# Altium footprint library Connectors.PcbLib: 70 footprints (part 1 of 5)
Each footprint in its own frame and in the unit in brackets; x right, y up, seen from the top. Pads: shape width x height; smd on the part's side, far side on the other; paste and mask are expansions set on the pad; w line width, h text height; cw(c..) or ccw(c..) is an arc to the next point about the centre after c.
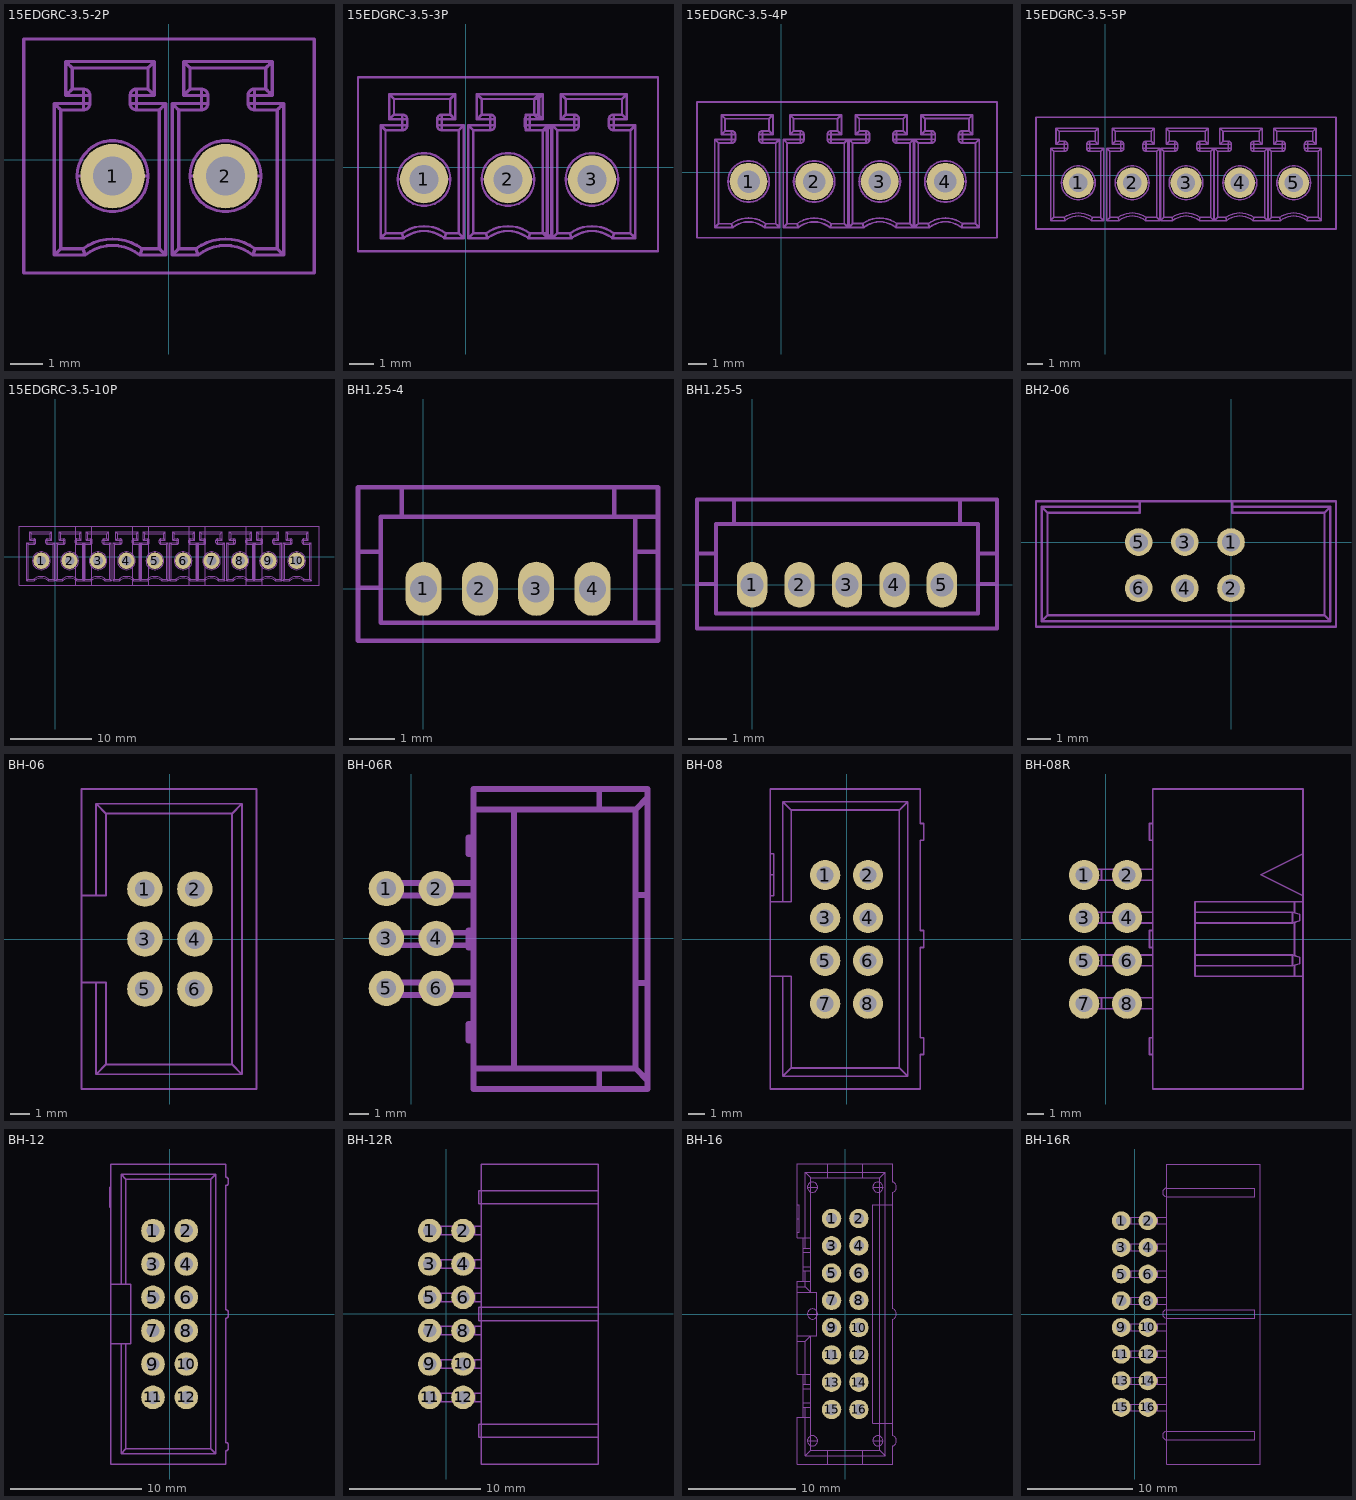
[diagram p0: the footprints below, top view; thin cyan lines are the x and y axes]

## 15EDGRC-3.5-2P [mm]
pads (2):
  round 2 hole 1.2: 1(-1.75,-0.5) 2(1.75,-0.5)
Top Assembly:
  drawing of 660 lines, arcs and shapes, not listed
3D body "12h8910_284514-2.stp": height 9.5, standoff -3.1, extent -4.5,-3.5 4.5,3.75

## 15EDGRC-3.5-3P [mm]
pads (3):
  round 2 hole 1.2: 1(-1.75,-0.5) 2(1.75,-0.5) 3(5.25,-0.5)
Top Assembly:
  drawing of 1141 lines, arcs and shapes, not listed
3D body "12h8910_284514-2.stp": height 9.5, standoff -3.1, extent -1,-3.5 8,3.75
3D body "12h8910_284514-2.stp": height 9.5, standoff -3.1, extent -4.5,-3.5 4.5,3.75

## 15EDGRC-3.5-4P [mm]
pads (4):
  round 2 hole 1.2: 1(-1.75,-0.5) 2(1.75,-0.5) 3(5.25,-0.5) 4(8.75,-0.5)
Top Assembly:
  drawing of 1317 lines, arcs and shapes, not listed
3D body "12h8910_284514-2.stp": height 9.5, standoff -3.1, extent -4.5,-3.5 4.5,3.75
3D body "12h8910_284514-2.stp": height 9.5, standoff -3.1, extent 2.5,-3.499 11.5,3.751

## 15EDGRC-3.5-5P [mm]
pads (5):
  round 2 hole 1.2: 1(-1.75,-0.5) 2(1.75,-0.5) 3(5.25,-0.5) 4(8.75,-0.5) 5(12.25,-0.5)
Top Assembly:
  drawing of 1700 lines, arcs and shapes, not listed
3D body "12h8910_284514-2.stp": height 9.5, standoff -3.1, extent -4.5,-3.5 4.5,3.75
3D body "12h8910_284514-2.stp": height 9.5, standoff -3.1, extent 2.5,-3.499 11.5,3.751
3D body "12h8910_284514-2.stp": height 9.5, standoff -3.1, extent 6,-3.499 15,3.751

## 15EDGRC-3.5-10P [mm]
pads (10):
  round 2 hole 1.2: 1(-1.75,-0.5) 2(1.75,-0.5) 3(5.25,-0.5) 4(8.75,-0.5) 5(12.25,-0.5) 6(15.75,-0.5) 7(19.25,-0.5) 8(22.75,-0.5) 9(26.25,-0.5) 10(29.75,-0.5)
Top Assembly:
  drawing of 3300 lines, arcs and shapes, not listed
3D body "12h8910_284514-2.stp": height 9.5, standoff -3.1, extent -4.5,-3.5 4.5,3.75
3D body "12h8910_284514-2.stp": height 9.5, standoff -3.1, extent 2.5,-3.5 11.5,3.75
3D body "12h8910_284514-2.stp": height 9.5, standoff -3.1, extent 9.5,-3.5 18.5,3.75
3D body "12h8910_284514-2.stp": height 9.5, standoff -3.1, extent 16.5,-3.5 25.5,3.75
3D body "12h8910_284514-2.stp": height 9.5, standoff -3.1, extent 23.5,-3.5 32.5,3.75

## BH1.25-4 [mm]
pads (4):
  oval 0.8x1.2 hole 0.6: 1(0,0) 2(1.25,0) 3(2.5,0) 4(3.75,0)
Top Assembly:
  lines w0.1: 4.7,-0.75 4.7,0.025 4.7,0.825 ; 5.2,-0.75 -0.95,-0.75 -0.95,0.025 ; 5.2,1.6 -0.475,1.6 ; -1.45,0.025 -1.45,-1.15 5.2,-1.15 5.2,0.025 5.2,0.825 ; -1.45,0.025 -0.95,0.025 ; -1.45,0.025 -1.45,0.825 ; -1.45,0.825 -1.45,2.25 -0.475,2.25 ; -1.45,0.825 -0.95,0.825 ; -0.95,0.025 -0.95,0.825 ; -0.95,0.825 -0.95,1.6 -0.475,1.6 ; -0.475,1.6 -0.475,2.25 ; -0.475,2.25 5.2,2.25 ; -0.175,-0.115 -0.1,-0.04 ; -0.175,-0.115 0.175,-0.115 ; -0.175,-0.115 -0.175,0.235 ; -0.175,-0.115 -0.1,-0.04 ; -0.175,0.235 -0.1,0.16 ; -0.175,0.235 0.175,0.235 ; -0.175,0.235 -0.1,0.16 ; -0.1,-0.04 0.1,-0.04 ; -0.1,-0.04 -0.1,0.16 ; -0.1,-0.04 -0.1,0.16 ; -0.1,-0.04 0.1,-0.04 ; -0.1,0.16 0.1,0.16 ; -0.1,0.16 0.1,0.16 ; 0.1,-0.04 0.175,-0.115 ; 0.1,-0.04 0.1,0.16 ; 0.1,-0.04 0.1,0.16 ; 0.1,-0.04 0.175,-0.115 ; 0.1,0.16 0.175,0.235 ; 0.1,0.16 0.175,0.235 ; 0.175,-0.115 0.175,0.235 ; 1.075,-0.115 1.425,-0.115 ; 1.075,-0.115 1.15,-0.04 ; 1.075,-0.115 1.075,0.235 ; 1.075,-0.115 1.15,-0.04 ; 1.075,0.235 1.425,0.235 ; 1.075,0.235 1.15,0.16 ; 1.075,0.235 1.15,0.16 ; 1.15,-0.04 1.35,-0.04 ; 1.15,-0.04 1.15,0.16 ; 1.15,-0.04 1.35,-0.04 ; 1.15,-0.04 1.15,0.16 ; 1.15,0.16 1.35,0.16 ; 1.15,0.16 1.35,0.16 ; 1.35,-0.04 1.425,-0.115 ; 1.35,-0.04 1.35,0.16 ; 1.35,-0.04 1.425,-0.115 ; 1.35,-0.04 1.35,0.16 ; 1.35,0.16 1.425,0.235 ; 1.35,0.16 1.425,0.235 ; 1.425,-0.115 1.425,0.235 ; 2.325,-0.115 2.325,0.235 ; 2.325,-0.115 2.4,-0.04 ; 2.325,-0.115 2.675,-0.115 ; 2.325,-0.115 2.4,-0.04 ; 2.325,0.235 2.4,0.16 ; 2.325,0.235 2.675,0.235 ; 2.325,0.235 2.4,0.16 ; 2.4,-0.04 2.6,-0.04 ; 2.4,-0.04 2.4,0.16 ; 2.4,-0.04 2.4,0.16 ; 2.4,-0.04 2.6,-0.04 ; 2.4,0.16 2.6,0.16 ; 2.4,0.16 2.6,0.16 ; 2.6,-0.04 2.675,-0.115 ; 2.6,-0.04 2.6,0.16 ; 2.6,-0.04 2.6,0.16 ; 2.6,-0.04 2.675,-0.115 ; 2.6,0.16 2.675,0.235 ; 2.6,0.16 2.675,0.235 ; 2.675,-0.115 2.675,0.235 ; 3.575,-0.115 3.925,-0.115 ; 3.575,-0.115 3.65,-0.04 ; 3.575,-0.115 3.575,0.235 ; 3.575,-0.115 3.65,-0.04 ; 3.575,0.235 3.925,0.235 ; 3.575,0.235 3.65,0.16 ; 3.575,0.235 3.65,0.16 ; 3.65,-0.04 3.85,-0.04 ; 3.65,-0.04 3.65,0.16 ; 3.65,-0.04 3.65,0.16 ; 3.65,-0.04 3.85,-0.04 ; 3.65,0.16 3.85,0.16 ; 3.65,0.16 3.85,0.16 ; 3.85,-0.04 3.925,-0.115 ; 3.85,-0.04 3.85,0.16 ; 3.85,-0.04 3.85,0.16 ; 3.85,-0.04 3.925,-0.115 ; 3.85,0.16 3.925,0.235 ; 3.85,0.16 3.925,0.235 ; 3.925,-0.115 3.925,0.235 ; 4.7,0.825 5.2,0.825 ; 4.7,0.825 4.7,1.6 4.225,1.6 4.225,2.25 5.2,2.25 ; 5.2,0.825 5.2,2.25

## BH1.25-5 [mm]
pads (5):
  oval 0.8x1.2 hole 0.6: 1(0,0) 2(1.25,0) 3(2.5,0) 4(3.75,0) 5(5,0)
Top Assembly:
  lines w0.1: -1.45,0.025 -1.45,0.825 ; -1.45,0.025 -0.95,0.025 ; -1.45,0.025 -1.45,-1.15 6.45,-1.15 6.45,0.025 ; -1.45,0.825 -0.95,0.825 ; -1.45,0.825 -1.45,2.25 -0.475,2.25 ; -0.95,0.025 -0.95,0.825 ; -0.95,0.025 -0.95,-0.75 5.95,-0.75 5.95,0.025 ; -0.95,0.825 -0.95,1.6 -0.475,1.6 ; -0.475,1.6 -0.475,2.25 ; -0.475,1.6 5.475,1.6 ; -0.475,2.25 5.475,2.25 ; -0.175,-0.115 -0.1,-0.04 ; -0.175,-0.115 -0.175,0.235 ; -0.175,-0.115 0.175,-0.115 ; -0.175,-0.115 -0.1,-0.04 ; -0.175,0.235 -0.1,0.16 ; -0.175,0.235 0.175,0.235 ; -0.175,0.235 -0.1,0.16 ; -0.1,-0.04 0.1,-0.04 ; -0.1,-0.04 -0.1,0.16 ; -0.1,-0.04 -0.1,0.16 ; -0.1,-0.04 0.1,-0.04 ; -0.1,0.16 0.1,0.16 ; -0.1,0.16 0.1,0.16 ; 0.1,-0.04 0.175,-0.115 ; 0.1,-0.04 0.1,0.16 ; 0.1,-0.04 0.1,0.16 ; 0.1,-0.04 0.175,-0.115 ; 0.1,0.16 0.175,0.235 ; 0.1,0.16 0.175,0.235 ; 0.175,-0.115 0.175,0.235 ; 1.075,-0.115 1.15,-0.04 ; 1.075,-0.115 1.075,0.235 ; 1.075,-0.115 1.15,-0.04 ; 1.075,-0.115 1.425,-0.115 ; 1.075,0.235 1.15,0.16 ; 1.075,0.235 1.15,0.16 ; 1.075,0.235 1.425,0.235 ; 1.15,-0.04 1.15,0.16 ; 1.15,-0.04 1.35,-0.04 ; 1.15,-0.04 1.15,0.16 ; 1.15,-0.04 1.35,-0.04 ; 1.15,0.16 1.35,0.16 ; 1.15,0.16 1.35,0.16 ; 1.35,-0.04 1.35,0.16 ; 1.35,-0.04 1.425,-0.115 ; 1.35,-0.04 1.35,0.16 ; 1.35,-0.04 1.425,-0.115 ; 1.35,0.16 1.425,0.235 ; 1.35,0.16 1.425,0.235 ; 1.425,-0.115 1.425,0.235 ; 2.325,-0.115 2.4,-0.04 ; 2.325,-0.115 2.675,-0.115 ; 2.325,-0.115 2.4,-0.04 ; 2.325,-0.115 2.325,0.235 ; 2.325,0.235 2.4,0.16 ; 2.325,0.235 2.675,0.235 ; 2.325,0.235 2.4,0.16 ; 2.4,-0.04 2.6,-0.04 ; 2.4,-0.04 2.4,0.16 ; 2.4,-0.04 2.4,0.16 ; 2.4,-0.04 2.6,-0.04 ; 2.4,0.16 2.6,0.16 ; 2.4,0.16 2.6,0.16 ; 2.6,-0.04 2.675,-0.115 ; 2.6,-0.04 2.6,0.16 ; 2.6,-0.04 2.6,0.16 ; 2.6,-0.04 2.675,-0.115 ; 2.6,0.16 2.675,0.235 ; 2.6,0.16 2.675,0.235 ; 2.675,-0.115 2.675,0.235 ; 3.575,-0.115 3.65,-0.04 ; 3.575,-0.115 3.575,0.235 ; 3.575,-0.115 3.65,-0.04 ; 3.575,-0.115 3.925,-0.115 ; 3.575,0.235 3.65,0.16 ; 3.575,0.235 3.65,0.16 ; 3.575,0.235 3.925,0.235 ; 3.65,-0.04 3.85,-0.04 ; 3.65,-0.04 3.65,0.16 ; 3.65,-0.04 3.65,0.16 ; 3.65,-0.04 3.85,-0.04 ; 3.65,0.16 3.85,0.16 ; 3.65,0.16 3.85,0.16 ; 3.85,-0.04 3.925,-0.115 ; 3.85,-0.04 3.85,0.16 ; 3.85,-0.04 3.85,0.16 ; 3.85,-0.04 3.925,-0.115 ; 3.85,0.16 3.925,0.235 ; 3.85,0.16 3.925,0.235 ; 3.925,-0.115 3.925,0.235 ; 4.825,-0.115 4.9,-0.04 ; 4.825,-0.115 4.825,0.235 ; 4.825,-0.115 4.9,-0.04 ; 4.825,-0.115 5.175,-0.115 ; 4.825,0.235 4.9,0.16 ; 4.825,0.235 5.175,0.235 ; 4.825,0.235 4.9,0.16 ; 4.9,-0.04 5.1,-0.04 ; 4.9,-0.04 4.9,0.16 ; 4.9,-0.04 4.9,0.16 ; 4.9,-0.04 5.1,-0.04 ; 4.9,0.16 5.1,0.16 ; 4.9,0.16 5.1,0.16 ; 5.1,-0.04 5.175,-0.115 ; 5.1,-0.04 5.1,0.16 ; 5.1,-0.04 5.1,0.16 ; 5.1,-0.04 5.175,-0.115 ; 5.1,0.16 5.175,0.235 ; 5.1,0.16 5.175,0.235 ; 5.175,-0.115 5.175,0.235 ; 5.475,1.6 5.95,1.6 5.95,0.825 ; 5.475,1.6 5.475,2.25 ; 5.475,2.25 6.45,2.25 6.45,0.825 ; 5.95,0.025 6.45,0.025 ; 5.95,0.025 5.95,0.825 ; 5.95,0.825 6.45,0.825 ; 6.45,0.025 6.45,0.825
3D body "df13-5p-1_25dsa_50_.stp": height 4.77, standoff -1.83, extent -1.45,-1.15 6.45,2.25

## BH2-06 [mm]
pads (6):
  round 1.2 hole 0.8 paste-25.4: 1(0,0) 2(0,-2) 3(-2,0) 4(-2,-2) 5(-4,0) 6(-4,-2)
Top Assembly:
  lines w0.1: 4,1.275 0.05,1.275 0.05,1.525 ; -8.2,-3.425 -7.95,-3.175 ; -8.2,-3.425 -8.2,1.525 ; -8.2,-3.425 4.3,-3.425 ; -8.2,1.525 -7.95,1.275 ; -8.2,1.525 -3.95,1.525 ; -7.95,-3.175 4.05,-3.175 ; -7.95,-3.175 -7.95,1.275 ; -7.95,1.275 -3.95,1.275 -3.95,1.525 ; -4.2,-2.2 -4.2,-1.7 ; -4.2,-2.2 -4.05,-2.05 ; -4.2,-2.2 -3.7,-2.2 ; -4.2,-1.7 -3.7,-1.7 ; -4.2,-1.7 -4.05,-1.85 ; -4.2,-0.2 -4.2,0.3 ; -4.2,-0.2 -4.05,-0.05 ; -4.2,-0.2 -3.7,-0.2 ; -4.2,0.3 -3.7,0.3 ; -4.2,0.3 -4.05,0.15 ; -4.05,-2.05 -4.05,-1.85 ; -4.05,-2.05 -3.85,-2.05 ; -4.05,-1.85 -3.85,-1.85 ; -4.05,-0.05 -4.05,0.15 ; -4.05,-0.05 -3.85,-0.05 ; -4.05,0.15 -3.85,0.15 ; -3.95,1.525 -3.95,1.775 ; -3.95,1.775 0.05,1.775 ; -3.95,1.775 -8.45,1.775 -8.45,-3.675 4.55,-3.675 4.55,1.775 0.05,1.775 ; -3.85,-2.05 -3.85,-1.85 ; -3.85,-2.05 -3.7,-2.2 ; -3.85,-1.85 -3.7,-1.7 ; -3.85,-0.05 -3.85,0.15 ; -3.85,-0.05 -3.7,-0.2 ; -3.85,0.15 -3.7,0.3 ; -3.7,-2.2 -3.7,-1.7 ; -3.7,-0.2 -3.7,0.3 ; -2.2,-2.2 -2.2,-1.7 ; -2.2,-2.2 -2.05,-2.05 ; -2.2,-2.2 -1.7,-2.2 ; -2.2,-1.7 -1.7,-1.7 ; -2.2,-1.7 -2.05,-1.85 ; -2.2,-0.2 -2.2,0.3 ; -2.2,-0.2 -2.05,-0.05 ; -2.2,-0.2 -1.7,-0.2 ; -2.2,0.3 -1.7,0.3 ; -2.2,0.3 -2.05,0.15 ; -2.05,-2.05 -2.05,-1.85 ; -2.05,-2.05 -1.85,-2.05 ; -2.05,-1.85 -1.85,-1.85 ; -2.05,-0.05 -2.05,0.15 ; -2.05,-0.05 -1.85,-0.05 ; -2.05,0.15 -1.85,0.15 ; -1.85,-2.05 -1.85,-1.85 ; -1.85,-2.05 -1.7,-2.2 ; -1.85,-1.85 -1.7,-1.7 ; -1.85,-0.05 -1.85,0.15 ; -1.85,-0.05 -1.7,-0.2 ; -1.85,0.15 -1.7,0.3 ; -1.7,-2.2 -1.7,-1.7 ; -1.7,-0.2 -1.7,0.3 ; -0.2,-2.2 0.3,-2.2 ; -0.2,-2.2 -0.05,-2.05 ; -0.2,-2.2 -0.2,-1.7 ; -0.2,-1.7 0.3,-1.7 ; -0.2,-1.7 -0.05,-1.85 ; -0.2,-0.2 0.3,-0.2 ; -0.2,-0.2 -0.05,-0.05 ; -0.2,-0.2 -0.2,0.3 ; -0.2,0.3 0.3,0.3 ; -0.2,0.3 -0.05,0.15 ; -0.05,-2.05 0.15,-2.05 ; -0.05,-2.05 -0.05,-1.85 ; -0.05,-1.85 0.15,-1.85 ; -0.05,-0.05 0.15,-0.05 ; -0.05,-0.05 -0.05,0.15 ; -0.05,0.15 0.15,0.15 ; 0.05,1.525 0.05,1.775 ; 0.05,1.525 4.3,1.525 ; 0.15,-2.05 0.15,-1.85 ; 0.15,-2.05 0.3,-2.2 ; 0.15,-1.85 0.3,-1.7 ; 0.15,-0.05 0.15,0.15 ; 0.15,-0.05 0.3,-0.2 ; 0.15,0.15 0.3,0.3 ; 0.3,-2.2 0.3,-1.7 ; 0.3,-0.2 0.3,0.3 ; 4.05,-3.175 4.05,1.275 4.3,1.525 ; 4.05,-3.175 4.3,-3.425 ; 4.3,-3.425 4.3,1.525

## BH-06 [mm]
pads (6):
  round 1.8 hole 1 paste-25.4: 1(-1.27,2.54) 2(1.27,2.54) 3(-1.27,0) 4(1.27,0) 5(-1.27,-2.54) 6(1.27,-2.54)
Top Assembly:
  lines w0.1: -4.492,-2.195 -4.492,2.205 ; -4.492,-2.195 -3.742,-2.195 ; -4.492,-2.195 -4.492,-7.615 4.408,-7.615 4.408,7.625 -4.492,7.625 -4.492,2.205 ; -4.492,2.205 -3.742,2.205 ; -3.742,-6.865 -3.242,-6.365 ; -3.742,-6.865 3.658,-6.865 ; -3.742,-6.865 -3.742,-2.195 ; -3.742,-2.195 -3.242,-2.195 -3.242,-6.365 ; -3.742,2.205 -3.242,2.205 -3.242,6.375 ; -3.742,2.205 -3.742,6.875 ; -3.742,6.875 -3.242,6.375 ; -3.742,6.875 3.658,6.875 ; -3.242,-6.365 3.158,-6.365 ; -3.242,6.375 3.158,6.375 ; -1.632,-2.855 -0.992,-2.855 ; -1.632,-2.855 -1.632,-2.215 ; -1.632,-2.855 -1.504,-2.727 ; -1.632,-2.215 -0.992,-2.215 ; -1.632,-2.215 -1.504,-2.343 ; -1.632,-0.315 -0.992,-0.315 ; -1.632,-0.315 -1.632,0.325 ; -1.632,-0.315 -1.504,-0.187 ; -1.632,0.325 -0.992,0.325 ; -1.632,0.325 -1.504,0.197 ; -1.632,2.225 -0.992,2.225 ; -1.632,2.225 -1.632,2.865 ; -1.632,2.225 -1.504,2.353 ; -1.632,2.865 -0.992,2.865 ; -1.632,2.865 -1.504,2.737 ; -1.504,-2.727 -1.504,-2.343 ; -1.504,-2.727 -1.12,-2.727 ; -1.504,-2.343 -1.12,-2.343 ; -1.504,-0.187 -1.504,0.197 ; -1.504,-0.187 -1.12,-0.187 ; -1.504,0.197 -1.12,0.197 ; -1.504,2.353 -1.504,2.737 ; -1.504,2.353 -1.12,2.353 ; -1.504,2.737 -1.12,2.737 ; -1.12,-2.727 -1.12,-2.343 ; -1.12,-2.727 -0.992,-2.855 ; -1.12,-2.343 -0.992,-2.215 ; -1.12,-0.187 -1.12,0.197 ; -1.12,-0.187 -0.992,-0.315 ; -1.12,0.197 -0.992,0.325 ; -1.12,2.353 -1.12,2.737 ; -1.12,2.353 -0.992,2.225 ; -1.12,2.737 -0.992,2.865 ; -0.992,-2.855 -0.992,-2.215 ; -0.992,-0.315 -0.992,0.325 ; -0.992,2.225 -0.992,2.865 ; 0.908,-2.855 1.548,-2.855 ; 0.908,-2.855 0.908,-2.215 ; 0.908,-2.855 1.036,-2.727 ; 0.908,-2.215 1.548,-2.215 ; 0.908,-2.215 1.036,-2.343 ; 0.908,-0.315 1.548,-0.315 ; 0.908,-0.315 0.908,0.325 ; 0.908,-0.315 1.036,-0.187 ; 0.908,0.325 1.548,0.325 ; 0.908,0.325 1.036,0.197 ; 0.908,2.225 1.548,2.225 ; 0.908,2.225 0.908,2.865 ; 0.908,2.225 1.036,2.353 ; 0.908,2.865 1.548,2.865 ; 0.908,2.865 1.036,2.737 ; 1.036,-2.727 1.036,-2.343 ; 1.036,-2.727 1.42,-2.727 ; 1.036,-2.343 1.42,-2.343 ; 1.036,-0.187 1.036,0.197 ; 1.036,-0.187 1.42,-0.187 ; 1.036,0.197 1.42,0.197 ; 1.036,2.353 1.036,2.737 ; 1.036,2.353 1.42,2.353 ; 1.036,2.737 1.42,2.737 ; 1.42,-2.727 1.42,-2.343 ; 1.42,-2.727 1.548,-2.855 ; 1.42,-2.343 1.548,-2.215 ; 1.42,-0.187 1.42,0.197 ; 1.42,-0.187 1.548,-0.315 ; 1.42,0.197 1.548,0.325 ; 1.42,2.353 1.42,2.737 ; 1.42,2.353 1.548,2.225 ; 1.42,2.737 1.548,2.865 ; 1.548,-2.855 1.548,-2.215 ; 1.548,-0.315 1.548,0.325 ; 1.548,2.225 1.548,2.865 ; 3.158,-6.365 3.158,6.375 ; 3.158,-6.365 3.658,-6.865 ; 3.158,6.375 3.658,6.875 ; 3.658,-6.865 3.658,6.875
3D body "User Library-BH_06.STEP": height 9.73, standoff -2.37, extent -4.492,-7.62 4.408,7.62

## BH-06R [mm]
pads (6):
  round 1.8 hole 1 paste-25.4: 1(-1.27,2.54) 2(1.27,2.54) 3(-1.27,0) 4(1.27,0) 5(-1.27,-2.54) 6(1.27,-2.54)
Top Assembly:
  lines w0.3: 2.925,-0.35 2.015,-0.35 ; 2.925,0.29 2.015,0.29 ; 3.175,-6.62 5.225,-6.62 ; 3.175,-5.205 2.925,-5.205 2.925,-4.355 3.175,-4.355 ; 3.175,-2.89 2.015,-2.89 ; 3.175,-2.25 2.015,-2.25 ; 3.175,-0.455 2.925,-0.455 2.925,0.395 3.175,0.395 ; 3.175,2.19 2.015,2.19 ; 3.175,2.83 2.015,2.83 ; 3.175,4.295 2.925,4.295 2.925,5.145 3.175,5.145 ; 3.175,6.56 5.225,6.56 ; 9.575,-7.67 9.575,-6.62 ; 9.575,6.56 9.575,7.61 ; 12.025,-7.22 11.425,-6.62 ; 12.025,-2.28 11.425,-2.28 11.425,-6.62 ; 12.025,2.22 11.425,2.22 11.425,6.56 ; 12.025,7.16 11.425,6.56 ; -1.525,-2.89 -1.325,-2.69 ; -1.525,-2.89 -0.885,-2.89 ; -1.525,-2.89 -1.525,-2.25 ; -1.525,-2.25 -1.325,-2.45 ; -1.525,-2.25 -0.885,-2.25 ; -1.525,-0.35 -1.325,-0.15 ; -1.525,-0.35 -0.885,-0.35 ; -1.525,-0.35 -1.525,0.29 ; -1.525,0.29 -1.325,0.09 ; -1.525,0.29 -0.885,0.29 ; -1.525,2.19 -1.325,2.39 ; -1.525,2.19 -0.885,2.19 ; -1.525,2.19 -1.525,2.83 ; -1.525,2.83 -1.325,2.63 ; -1.525,2.83 -0.885,2.83 ; -1.325,-2.69 -1.325,-2.45 ; -1.325,-2.69 -1.085,-2.69 ; -1.325,-2.45 -1.085,-2.45 ; -1.325,-0.15 -1.325,0.09 ; -1.325,-0.15 -1.085,-0.15 ; -1.325,0.09 -1.085,0.09 ; -1.325,2.39 -1.325,2.63 ; -1.325,2.39 -1.085,2.39 ; -1.325,2.63 -1.085,2.63 ; -1.085,-2.69 -1.085,-2.45 ; -1.085,-2.69 -0.885,-2.89 ; -1.085,-2.45 -0.885,-2.25 ; -1.085,-0.15 -1.085,0.09 ; -1.085,-0.15 -0.885,-0.35 ; -1.085,0.09 -0.885,0.29 ; -1.085,2.39 -1.085,2.63 ; -1.085,2.39 -0.885,2.19 ; -1.085,2.63 -0.885,2.83 ; -0.885,-2.89 -0.525,-2.89 ; -0.885,-2.89 -0.885,-2.25 ; -0.885,-2.25 -0.525,-2.25 ; -0.885,-0.35 -0.525,-0.35 ; -0.885,-0.35 -0.885,0.29 ; -0.885,0.29 -0.525,0.29 ; -0.885,2.19 -0.525,2.19 ; -0.885,2.19 -0.885,2.83 ; -0.885,2.83 -0.525,2.83 ; -0.525,-2.89 1.015,-2.89 ; -0.525,-2.89 -0.525,-2.25 ; -0.525,-2.89 -0.525,-2.25 ; -0.525,-2.25 1.015,-2.25 ; -0.525,-0.35 1.015,-0.35 ; -0.525,-0.35 -0.525,0.29 ; -0.525,-0.35 -0.525,0.29 ; -0.525,0.29 1.015,0.29 ; -0.525,2.19 1.015,2.19 ; -0.525,2.19 -0.525,2.83 ; -0.525,2.19 -0.525,2.83 ; -0.525,2.83 1.015,2.83 ; 1.015,-2.89 1.655,-2.89 ; 1.015,-2.89 1.215,-2.69 ; 1.015,-2.89 1.015,-2.25 ; 1.015,-2.25 1.655,-2.25 ; 1.015,-2.25 1.215,-2.45 ; 1.015,-0.35 1.655,-0.35 ; 1.015,-0.35 1.215,-0.15 ; 1.015,-0.35 1.015,0.29 ; 1.015,0.29 1.655,0.29 ; 1.015,0.29 1.215,0.09 ; 1.015,2.19 1.655,2.19 ; 1.015,2.19 1.215,2.39 ; 1.015,2.19 1.015,2.83 ; 1.015,2.83 1.655,2.83 ; 1.015,2.83 1.215,2.63 ; 1.215,-2.69 1.455,-2.69 ; 1.215,-2.69 1.215,-2.45 ; 1.215,-2.45 1.455,-2.45 ; 1.215,-0.15 1.455,-0.15 ; 1.215,-0.15 1.215,0.09 ; 1.215,0.09 1.455,0.09 ; 1.215,2.39 1.455,2.39 ; 1.215,2.39 1.215,2.63 ; 1.215,2.63 1.455,2.63 ; 1.455,-2.69 1.655,-2.89 ; 1.455,-2.69 1.455,-2.45 ; 1.455,-2.45 1.655,-2.25 ; 1.455,-0.15 1.655,-0.35 ; 1.455,-0.15 1.455,0.09 ; 1.455,0.09 1.655,0.29 ; 1.455,2.39 1.655,2.19 ; 1.455,2.39 1.455,2.63 ; 1.455,2.63 1.655,2.83 ; 1.655,-2.89 1.655,-2.25 ; 1.655,-2.89 2.015,-2.89 ; 1.655,-2.25 2.015,-2.25 ; 1.655,-0.35 1.655,0.29 ; 1.655,-0.35 2.015,-0.35 ; 1.655,0.29 2.015,0.29 ; 1.655,2.19 1.655,2.83 ; 1.655,2.19 2.015,2.19 ; 1.655,2.83 2.015,2.83 ; 2.015,-2.89 2.015,-2.25 ; 2.015,-2.89 2.015,-2.25 ; 2.015,-0.35 2.015,0.29 ; 2.015,-0.35 2.015,0.29 ; 2.015,2.19 2.015,2.83 ; 2.015,2.19 2.015,2.83 ; 5.225,-6.62 11.425,-6.62 ; 5.225,-6.62 5.225,6.56 ; 5.225,6.56 11.425,6.56 ; 11.425,-6.62 11.425,6.56 ; 3.175,-7.67 12.025,-7.67 12.025,-5.52 12.025,-4.87 12.025,4.81 12.025,5.46 12.025,7.61 3.175,7.61 3.175,5.46 3.175,4.81 3.175,-4.87 3.175,-5.52 3.175,-7.67
3D body "65715.stp": height 9.43, standoff -2.4, extent -1.525,-7.64 12.025,7.64

## BH-08 [mm]
pads (8):
  round 1.8 hole 1: 1(-1.27,3.81) 2(1.27,3.81) 3(-1.27,1.27) 4(1.27,1.27) 5(-1.27,-1.27) 6(1.27,-1.27) 7(-1.27,-3.81) 8(1.27,-3.81)
Top Assembly:
  lines w0.1: -4.324,3.829 -4.524,3.829 ; -4.524,-2.181 -4.524,-8.871 4.376,-8.871 4.376,-6.831 4.576,-6.831 4.576,-5.831 4.376,-5.831 4.376,-0.481 4.576,-0.481 4.576,0.519 4.376,0.519 4.376,5.869 4.576,5.869 4.576,6.869 4.376,6.869 4.376,8.909 -4.524,8.909 -4.524,5.079 ; -4.524,-2.181 -3.774,-2.181 ; -4.524,-2.181 -4.524,2.219 ; -4.524,2.219 -3.774,2.219 ; -4.524,2.219 -4.524,2.579 ; -4.524,2.579 -4.324,2.579 -4.324,5.079 -4.524,5.079 ; -4.524,2.579 -4.524,3.829 ; -4.524,3.829 -4.524,5.079 ; -3.774,-8.121 -3.774,-2.181 ; -3.774,-8.121 -3.274,-7.621 ; -3.774,-8.121 3.626,-8.121 ; -3.774,-2.181 -3.274,-2.181 -3.274,-7.621 ; -3.774,2.219 -3.774,8.159 ; -3.774,2.219 -3.274,2.219 -3.274,7.659 ; -3.774,8.159 3.626,8.159 ; -3.774,8.159 -3.274,7.659 ; -3.274,-7.621 3.126,-7.621 ; -3.274,7.659 3.126,7.659 ; -1.664,-4.111 -1.536,-3.983 ; -1.664,-4.111 -1.664,-3.471 ; -1.664,-4.111 -1.024,-4.111 ; -1.664,-3.471 -1.536,-3.599 ; -1.664,-3.471 -1.024,-3.471 ; -1.664,-1.571 -1.536,-1.443 ; -1.664,-1.571 -1.024,-1.571 ; -1.664,-1.571 -1.664,-0.931 ; -1.664,-0.931 -1.536,-1.059 ; -1.664,-0.931 -1.024,-0.931 ; -1.664,0.969 -1.536,1.097 ; -1.664,0.969 -1.024,0.969 ; -1.664,0.969 -1.664,1.609 ; -1.664,1.609 -1.536,1.481 ; -1.664,1.609 -1.024,1.609 ; -1.664,3.509 -1.536,3.637 ; -1.664,3.509 -1.664,4.149 ; -1.664,3.509 -1.024,3.509 ; -1.664,4.149 -1.536,4.021 ; -1.664,4.149 -1.024,4.149 ; -1.536,-3.983 -1.536,-3.599 ; -1.536,-3.983 -1.152,-3.983 ; -1.536,-3.599 -1.152,-3.599 ; -1.536,-1.443 -1.152,-1.443 ; -1.536,-1.443 -1.536,-1.059 ; -1.536,-1.059 -1.152,-1.059 ; -1.536,1.097 -1.152,1.097 ; -1.536,1.097 -1.536,1.481 ; -1.536,1.481 -1.152,1.481 ; -1.536,3.637 -1.536,4.021 ; -1.536,3.637 -1.152,3.637 ; -1.536,4.021 -1.152,4.021 ; -1.152,-3.983 -1.024,-4.111 ; -1.152,-3.983 -1.152,-3.599 ; -1.152,-3.599 -1.024,-3.471 ; -1.152,-1.443 -1.024,-1.571 ; -1.152,-1.443 -1.152,-1.059 ; -1.152,-1.059 -1.024,-0.931 ; -1.152,1.097 -1.152,1.481 ; -1.152,1.097 -1.024,0.969 ; -1.152,1.481 -1.024,1.609 ; -1.152,3.637 -1.152,4.021 ; -1.152,3.637 -1.024,3.509 ; -1.152,4.021 -1.024,4.149 ; -1.024,-4.111 -1.024,-3.471 ; -1.024,-1.571 -1.024,-0.931 ; -1.024,0.969 -1.024,1.609 ; -1.024,3.509 -1.024,4.149 ; 0.876,-4.111 1.004,-3.983 ; 0.876,-4.111 1.516,-4.111 ; 0.876,-4.111 0.876,-3.471 ; 0.876,-3.471 1.004,-3.599 ; 0.876,-3.471 1.516,-3.471 ; 0.876,-1.571 1.004,-1.443 ; 0.876,-1.571 0.876,-0.931 ; 0.876,-1.571 1.516,-1.571 ; 0.876,-0.931 1.004,-1.059 ; 0.876,-0.931 1.516,-0.931 ; 0.876,0.969 1.004,1.097 ; 0.876,0.969 1.516,0.969 ; 0.876,0.969 0.876,1.609 ; 0.876,1.609 1.004,1.481 ; 0.876,1.609 1.516,1.609 ; 0.876,3.509 1.004,3.637 ; 0.876,3.509 1.516,3.509 ; 0.876,3.509 0.876,4.149 ; 0.876,4.149 1.004,4.021 ; 0.876,4.149 1.516,4.149 ; 1.004,-3.983 1.388,-3.983 ; 1.004,-3.983 1.004,-3.599 ; 1.004,-3.599 1.388,-3.599 ; 1.004,-1.443 1.004,-1.059 ; 1.004,-1.443 1.388,-1.443 ; 1.004,-1.059 1.388,-1.059 ; 1.004,1.097 1.388,1.097 ; 1.004,1.097 1.004,1.481 ; 1.004,1.481 1.388,1.481 ; 1.004,3.637 1.388,3.637 ; 1.004,3.637 1.004,4.021 ; 1.004,4.021 1.388,4.021 ; 1.388,-3.983 1.516,-4.111 ; 1.388,-3.983 1.388,-3.599 ; 1.388,-3.599 1.516,-3.471 ; 1.388,-1.443 1.388,-1.059 ; 1.388,-1.443 1.516,-1.571 ; 1.388,-1.059 1.516,-0.931 ; 1.388,1.097 1.388,1.481 ; 1.388,1.097 1.516,0.969 ; 1.388,1.481 1.516,1.609 ; 1.388,3.637 1.516,3.509 ; 1.388,3.637 1.388,4.021 ; 1.388,4.021 1.516,4.149 ; 1.516,-4.111 1.516,-3.471 ; 1.516,-1.571 1.516,-0.931 ; 1.516,0.969 1.516,1.609 ; 1.516,3.509 1.516,4.149 ; 3.126,-7.621 3.626,-8.121 ; 3.126,-7.621 3.126,7.659 ; 3.126,7.659 3.626,8.159 ; 3.626,-8.121 3.626,8.159
3D body "User Library-BH_08_V.STEP": height 8.9, standoff -3.2, extent -4.47,-8.85 4.63,8.93

## BH-08R [mm]
pads (8):
  round 1.8 hole 1: 1(-1.27,3.81) 2(1.27,3.81) 3(-1.27,1.27) 4(1.27,1.27) 5(-1.27,-1.27) 6(1.27,-1.27) 7(-1.27,-3.81) 8(1.27,-3.81)
Top Assembly:
  lines w0.1: 2.8,-6.831 2.6,-6.831 2.6,-5.831 2.8,-5.831 ; 2.8,-4.111 -0.24,-4.111 ; 2.8,-3.471 -0.24,-3.471 ; 2.8,-1.571 -0.24,-1.571 ; 2.8,-0.931 -0.24,-0.931 ; 2.8,-0.481 2.6,-0.481 2.6,0.519 2.8,0.519 ; 2.8,0.969 -0.24,0.969 ; 2.8,1.609 -0.24,1.609 ; 2.8,3.509 -0.24,3.509 ; 2.8,4.149 -0.24,4.149 ; 2.8,5.869 2.6,5.869 2.6,6.869 2.8,6.869 ; 5.3,-1.571 11.073,-1.571 ; 5.3,-0.931 11.073,-0.931 ; 5.3,0.969 11.073,0.969 ; 5.3,1.609 11.073,1.609 ; 11.2,-2.181 11.2,-1.533 ; 11.2,-0.969 11.2,1.007 ; 11.2,1.571 11.2,2.219 ; -0.24,-4.111 -0.24,-3.471 ; -0.24,-4.111 -1.52,-4.111 -1.52,-3.471 -0.24,-3.471 ; -0.24,-1.571 -0.24,-0.931 ; -0.24,-1.571 -1.52,-1.571 -1.52,-0.931 -0.24,-0.931 ; -0.24,0.969 -0.24,1.609 ; -0.24,0.969 -1.52,0.969 -1.52,1.609 -0.24,1.609 ; -0.24,3.509 -0.24,4.149 ; -0.24,3.509 -1.52,3.509 -1.52,4.149 -0.24,4.149 ; 11.073,-1.571 11.5,-1.443 11.5,-1.059 11.073,-0.931 ; 11.073,-1.571 11.073,-0.931 ; 11.073,0.969 11.5,1.097 11.5,1.481 11.073,1.609 ; 11.073,0.969 11.073,1.609 ; 11.7,-2.181 11.7,2.219 ; 11.7,-2.181 11.7,-8.871 2.8,-8.871 2.8,8.909 11.7,8.909 11.7,5.079 ; 11.7,-2.181 5.3,-2.181 5.3,2.219 11.7,2.219 ; 11.7,2.219 11.7,2.579 ; 11.7,2.579 11.7,5.079 ; 11.7,2.579 9.2,3.829 11.7,5.079
3D body "User Library-BH_08_H.STEP": height 9.45, standoff -2.62, extent -1.52,-8.871 11.7,8.909

## BH-12 [mm]
pads (12):
  round 1.8 hole 1: 1(-1.27,6.35) 2(1.27,6.35) 3(-1.27,3.81) 4(1.27,3.81) 5(-1.27,1.27) 6(1.27,1.27) 7(-1.27,-1.27) 8(1.27,-1.27) 9(-1.27,-3.81) 10(1.27,-3.81) 11(-1.27,-6.35) 12(1.27,-6.35)
Top Assembly:
  drawing of 186 lines, arcs and shapes, not listed
3D body "User Library-BH-12.STEP": height 9.1, standoff -3.1, extent -4.575,-11.45 4.475,11.41

## BH-12R [mm]
pads (12):
  round 1.8 hole 1: 1(-1.27,6.35) 2(1.27,6.35) 3(-1.27,3.81) 4(1.27,3.81) 5(-1.27,1.27) 6(1.27,1.27) 7(-1.27,-1.27) 8(1.27,-1.27) 9(-1.27,-3.81) 10(1.27,-3.81) 11(-1.27,-6.35) 12(1.27,-6.35)
Top Assembly:
  drawing of 379 lines, arcs and shapes, not listed
3D body "User Library-BH_12_H.STEP": height 9.45, standoff -2.62, extent -1.524,-11.43 11.696,11.43

## BH-16 [mm]
pads (16):
  round 1.8 hole 1: 1(-1.27,8.89) 2(1.27,8.89) 3(-1.27,6.35) 4(1.27,6.35) 5(-1.27,3.81) 6(1.27,3.81) 7(-1.27,1.27) 8(1.27,1.27) 9(-1.27,-1.27) 10(1.27,-1.27) 11(-1.27,-3.81) 12(1.27,-3.81) 13(-1.27,-6.35) 14(1.27,-6.35) 15(-1.27,-8.89) 16(1.27,-8.89)
Top Assembly:
  drawing of 173 lines, arcs and shapes, not listed
3D body "2-1761603-6.stp": height 10, standoff -1.81, extent -4.445,-13.97 4.775,13.97

## BH-16R [mm]
pads (16):
  round 1.8 hole 1: 1(-1.27,8.89) 2(1.27,8.89) 3(-1.27,6.35) 4(1.27,6.35) 5(-1.27,3.81) 6(1.27,3.81) 7(-1.27,1.27) 8(1.27,1.27) 9(-1.27,-1.27) 10(1.27,-1.27) 11(-1.27,-3.81) 12(1.27,-3.81) 13(-1.27,-6.35) 14(1.27,-6.35) 15(-1.27,-8.89) 16(1.27,-8.89)
Top Assembly:
  drawing of 294 lines, arcs and shapes, not listed
3D body "User Library-IDC Socket Male 16pin Angled THT Goldplated 2_54mm.step": height 9.98, standoff -1.37, extent -1.495,-14.28 12.065,14.28